# Altium footprint library Molex FFC - FPC Connectors (Through-Hole).PcbLib: 219 footprints (part 6 of 14)
Each footprint in its own frame and in the unit in brackets; x right, y up, seen from the top. Pads: shape width x height; smd on the part's side, far side on the other; paste and mask are expansions set on the pad; w line width, h text height; cw(c..) or ccw(c..) is an arc to the next point about the centre after c.
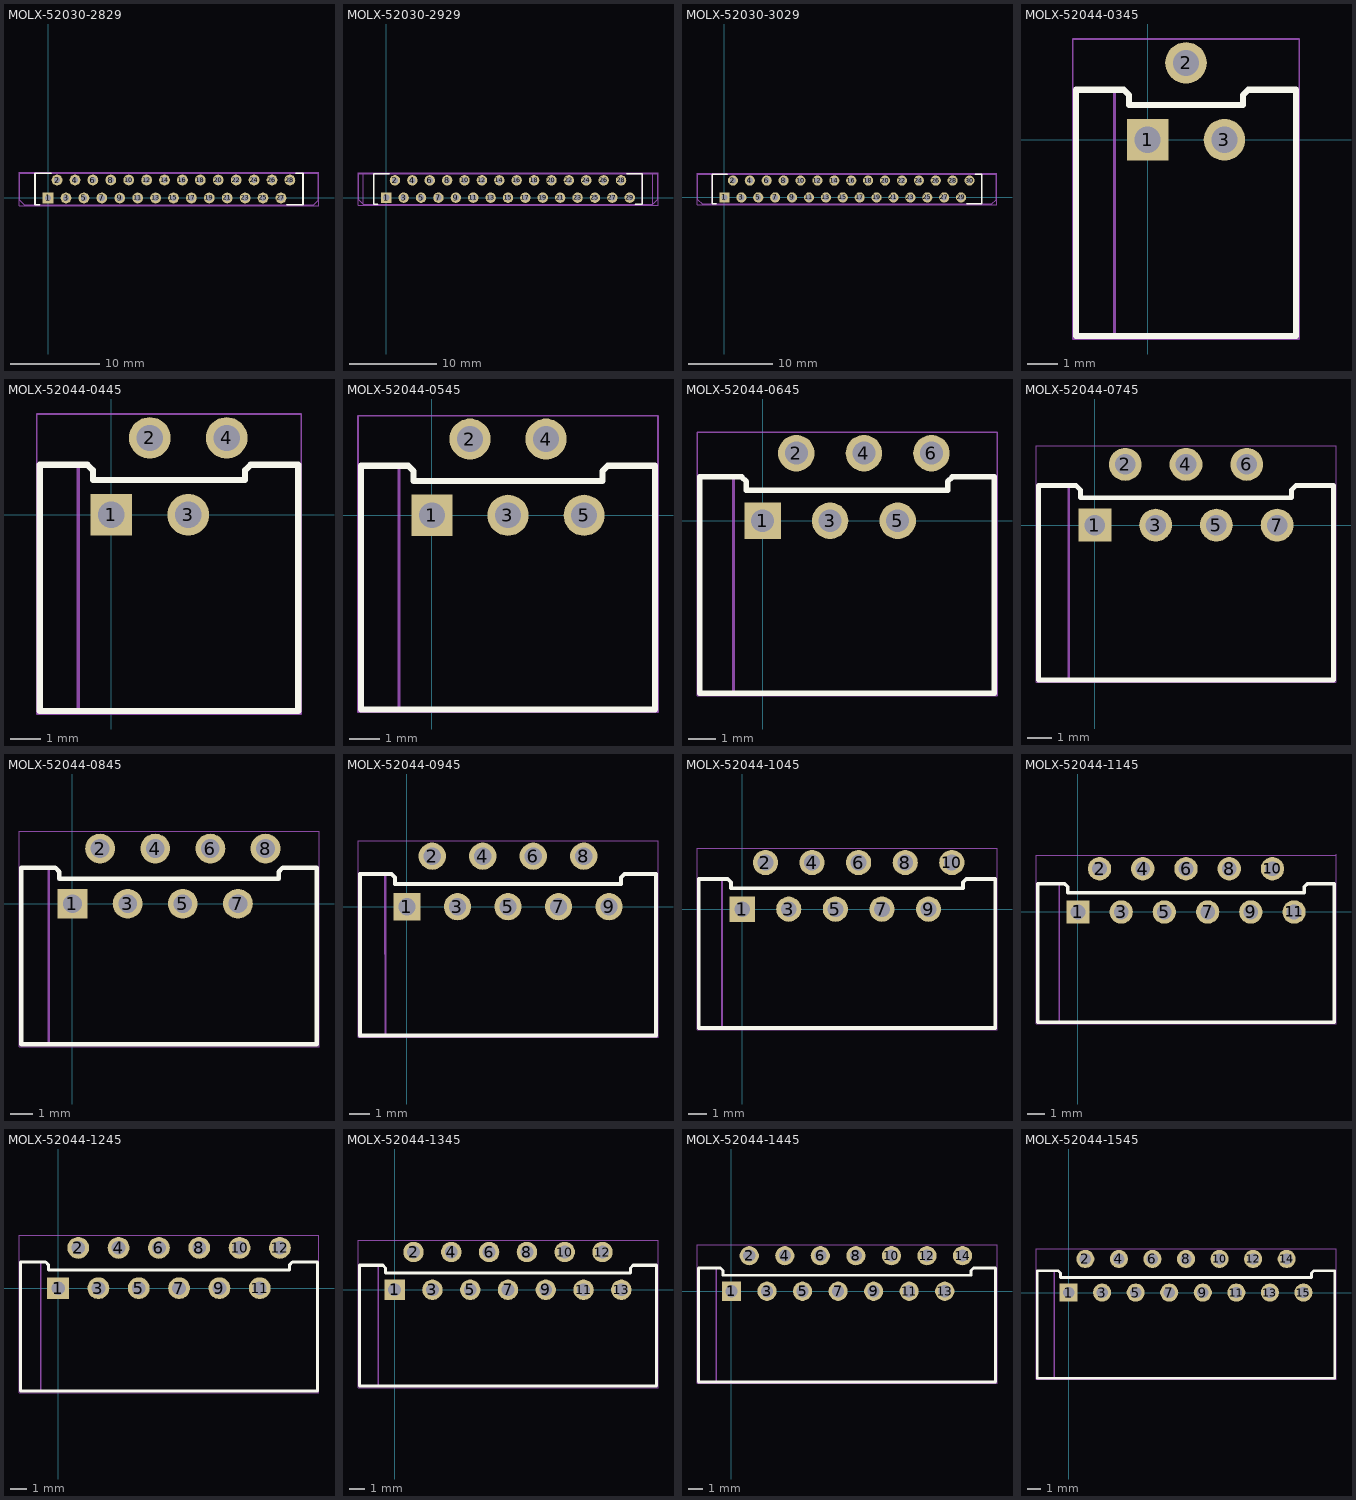
[diagram p5: the footprints below, top view; thin cyan lines are the x and y axes]

## MOLX-52030-2829 [mm] "FPC Connector, 28-Leads, Vertical, Pitch 1.0 mm, Mated Height 5.2 mm, Through Hole"
height 6.712
pads (28):
  rect 1.2x1.2 hole 0.7: 1(0,0)
  round 1.2 hole 0.7: 2(1,2) 3(2,0) 4(3,2) 5(4,0) 6(5,2) 7(6,0) 8(7,2) 9(8,0) 10(9,2) 11(10,0) 12(11,2) 13(12,0) 14(13,2) 15(14,0) 16(15,2) 17(16,0) 18(17,2) 19(18,0) 20(19,2) 21(20,0) 22(21,2) 23(22,0) 24(23,2) 25(24,0) 26(25,2) 27(26,0) 28(27,2)
Top Overlay:
  lines w0.2: -0.971,-0.75 -1.45,-0.75 -1.45,2.75 0.339,2.75 ; 26.661,-0.75 28.45,-0.75 28.45,2.75 27.662,2.75
Mechanical 13:
  lines w0.1: -3.15,2.75 30.15,2.75 30.15,-0.25 29.65,-0.749 ; -3.15,2.75 -3.15,-0.25 -2.65,-0.75 29.65,-0.75 ; -1.45,-0.75 -1.45,2.75 ; 28.45,-0.75 28.45,2.75
Mechanical 15:
  lines w0.05: -3.25,-0.85 -3.25,2.85 30.25,2.85 30.25,-0.85 -3.25,-0.85
3D body "520302829.stp": height 6.71, standoff -3.19, extent -3.15,-0.75 30.15,2.75

## MOLX-52030-2929 [mm] "FPC Connector, 29-Leads, Vertical, Pitch 1.0 mm, Mated Height 5.2 mm, Through Hole"
height 6.712
pads (29):
  rect 1.2x1.2 hole 0.7: 1(0,0)
  round 1.2 hole 0.7: 2(1,2) 3(2,0) 4(3,2) 5(4,0) 6(5,2) 7(6,0) 8(7,2) 9(8,0) 10(9,2) 11(10,0) 12(11,2) 13(12,0) 14(13,2) 15(14,0) 16(15,2) 17(16,0) 18(17,2) 19(18,0) 20(19,2) 21(20,0) 22(21,2) 23(22,0) 24(23,2) 25(24,0) 26(25,2) 27(26,0) 28(27,2) 29(28,0)
Top Overlay:
  lines w0.2: -0.971,-0.75 -1.45,-0.75 -1.45,2.75 0.339,2.75 ; 27.661,2.75 29.45,2.75 29.45,-0.75 28.662,-0.75
Mechanical 13:
  lines w0.1: -2.65,-0.75 -1.45,-0.75 ; -2.65,-0.75 -2.65,2.75 ; -2.65,-0.75 -3.15,-0.25 -3.15,2.75 -2.65,2.75 ; -2.65,2.75 -1.45,2.75 ; -1.45,-0.75 29.45,-0.75 ; -1.45,-0.75 -1.45,2.75 ; -1.45,2.75 29.45,2.75 ; 29.45,-0.75 29.45,2.75 ; 29.45,-0.75 30.65,-0.75 ; 29.45,2.75 30.65,2.75 ; 30.65,-0.75 30.65,2.75 ; 30.65,-0.75 31.15,-0.25 31.15,2.75 30.65,2.75
Mechanical 15:
  lines w0.05: -3.25,-0.85 -3.25,2.85 31.25,2.85 31.25,-0.85 -3.25,-0.85
3D body "520302929.stp": height 6.71, standoff -3.19, extent -3.15,-0.75 31.15,2.75

## MOLX-52030-3029 [mm] "FPC Connector, 30-Leads, Vertical, Pitch 1.0 mm, Mated Height 5.2 mm, Through Hole"
height 6.712
pads (30):
  rect 1.2x1.2 hole 0.7: 1(0,0)
  round 1.2 hole 0.7: 2(1,2) 3(2,0) 4(3,2) 5(4,0) 6(5,2) 7(6,0) 8(7,2) 9(8,0) 10(9,2) 11(10,0) 12(11,2) 13(12,0) 14(13,2) 15(14,0) 16(15,2) 17(16,0) 18(17,2) 19(18,0) 20(19,2) 21(20,0) 22(21,2) 23(22,0) 24(23,2) 25(24,0) 26(25,2) 27(26,0) 28(27,2) 29(28,0) 30(29,2)
Top Overlay:
  lines w0.2: -0.971,-0.75 -1.45,-0.75 -1.45,2.75 0.339,2.75 ; 28.661,-0.75 30.45,-0.75 30.45,2.75 29.661,2.75
Mechanical 13:
  lines w0.1: -1.45,-0.75 -1.45,2.75 ; 30.45,-0.75 30.45,2.75 ; -3.15,-0.25 -3.15,2.75 32.15,2.75 32.15,-0.25 31.65,-0.75 -2.65,-0.75 -3.15,-0.25
Mechanical 15:
  lines w0.05: -3.25,-0.85 -3.25,2.85 32.25,2.85 32.25,-0.85 -3.25,-0.85
3D body "520303029.stp": height 6.71, standoff -3.19, extent -3.15,-0.75 32.15,2.75

## MOLX-52044-0345 [mm] "FFC Connector, 3-Leads, Right Angle, Pitch 1.25 mm, Mated Height 5.1 mm, Through Hole"
height 5.012
pads (3):
  rect 1.35x1.35 hole 0.85: 1(0,0)
  round 1.35 hole 0.85: 2(1.25,2.5) 3(2.5,0)
Top Overlay:
  lines w0.2: -0.775,1.625 -0.6,1.45 -0.6,1.125 3.1,1.125 3.1,1.45 3.275,1.625 ; -0.775,1.625 -0.775,1.625 ; -0.775,1.625 -2.325,1.625 -2.325,-6.375 4.825,-6.375 4.825,1.625 3.275,1.625 ; 3.275,1.625 3.275,1.625
Mechanical 13:
  lines w0.1: -1.075,-6.375 -1.075,1.625 ; -2.325,-6.375 -2.325,1.625 -0.775,1.625 -0.6,1.45 -0.6,1.125 3.1,1.125 3.1,1.45 3.275,1.625 4.825,1.625 4.825,-6.375 -2.325,-6.375
Mechanical 15:
  lines w0.05: -2.425,-6.475 4.925,-6.475 4.925,3.275 -2.425,3.275 -2.425,-6.475
3D body "520440345.stp": height 5.01, standoff -3.49, extent -2.325,-6.375 4.825,2.625

## MOLX-52044-0445 [mm] "FFC Connector, 4-Leads, Right Angle, Pitch 1.25 mm, Mated Height 5.1 mm, Through Hole"
height 5.012
pads (4):
  rect 1.35x1.35 hole 0.85: 1(0,0)
  round 1.35 hole 0.85: 2(1.25,2.5) 3(2.5,0) 4(3.75,2.5)
Top Overlay:
  lines w0.2: -2.325,-6.375 -2.325,1.625 -0.775,1.625 ; -2.325,-6.375 6.075,-6.375 ; 6.075,-6.375 6.075,1.625 4.525,1.625 ; -0.775,1.625 -0.775,1.625 ; -0.775,1.625 -0.6,1.45 -0.6,1.125 4.35,1.125 4.35,1.45 4.525,1.625 ; 4.525,1.625 4.525,1.625
Mechanical 13:
  lines w0.1: -1.075,-6.375 -1.075,1.625 ; 6.075,1.625 6.075,-6.375 -2.325,-6.375 -2.325,-6.375 ; 6.075,1.625 4.525,1.625 4.35,1.45 4.35,1.125 -0.6,1.125 -0.6,1.45 -0.775,1.625 -2.325,1.625 -2.325,-6.375 ; -2.325,-6.375 -2.325,-6.375
Mechanical 15:
  lines w0.05: -2.425,-6.475 -2.425,3.275 6.175,3.275 6.175,-6.475 -2.425,-6.475
3D body "520440445.stp": height 5.01, standoff -3.49, extent -2.325,-6.375 6.075,2.625

## MOLX-52044-0545 [mm] "FFC Connector, 5-Leads, Right Angle, Pitch 1.25 mm, Mated Height 5.1 mm, Through Hole"
height 5.012
pads (5):
  rect 1.35x1.35 hole 0.85: 1(0,0)
  round 1.35 hole 0.85: 2(1.25,2.5) 3(2.5,0) 4(3.75,2.5) 5(5,0)
Top Overlay:
  lines w0.2: 5.6,1.125 5.6,1.45 5.775,1.625 ; 5.6,1.125 -0.6,1.125 -0.6,1.45 -0.775,1.625 ; -0.775,1.625 -0.775,1.625 ; -0.775,1.625 -2.325,1.625 -2.325,-6.375 7.325,-6.375 7.325,1.625 5.775,1.625 ; 5.775,1.625 5.775,1.625
Mechanical 13:
  lines w0.1: -1.075,-6.375 -1.075,1.625 ; -2.325,-6.375 -2.325,1.625 -0.775,1.625 -0.6,1.45 -0.6,1.125 5.6,1.125 5.6,1.45 5.775,1.625 7.325,1.625 7.325,-6.375 -2.325,-6.375
Mechanical 15:
  lines w0.05: -2.425,-6.475 7.425,-6.475 7.425,3.275 -2.425,3.275 -2.425,-6.475
3D body "520440545.stp": height 5.01, standoff -3.49, extent -2.325,-6.375 7.325,2.625

## MOLX-52044-0645 [mm] "FFC Connector, 6-Leads, Right Angle, Pitch 1.25 mm, Mated Height 5.1 mm, Through Hole"
height 5.012
pads (6):
  rect 1.35x1.35 hole 0.85: 1(0,0)
  round 1.35 hole 0.85: 2(1.25,2.5) 3(2.5,0) 4(3.75,2.5) 5(5,0) 6(6.25,2.5)
Top Overlay:
  lines w0.2: -2.325,1.625 -2.325,-6.375 8.575,-6.375 8.575,1.625 ; -2.325,1.625 -0.775,1.625 ; 8.575,1.625 7.025,1.625 7.025,1.625 6.85,1.45 6.85,1.125 -0.6,1.125 -0.6,1.45 -0.775,1.625 ; -0.775,1.625 -0.775,1.625
Mechanical 13:
  lines w0.1: -1.075,-6.375 -1.075,1.625 ; 8.575,1.625 8.575,-6.375 -2.325,-6.375 -2.325,1.625 -0.775,1.625 -0.6,1.45 -0.6,1.125 6.85,1.125 6.85,1.45 7.025,1.625 8.575,1.625
Mechanical 15:
  lines w0.05: -2.425,-6.475 -2.425,3.275 8.675,3.275 8.675,-6.475 -2.425,-6.475
3D body "520440645.stp": height 5.01, standoff -3.49, extent -2.325,-6.375 8.575,2.625

## MOLX-52044-0745 [mm] "FFC Connector, 7-Leads, Right Angle, Pitch 1.25 mm, Mated Height 5.1 mm, Through Hole"
height 5.012
pads (7):
  rect 1.35x1.35 hole 0.85: 1(0,0)
  round 1.35 hole 0.85: 2(1.25,2.5) 3(2.5,0) 4(3.75,2.5) 5(5,0) 6(6.25,2.5) 7(7.5,0)
Top Overlay:
  lines w0.2: -2.325,-6.375 9.825,-6.375 9.825,1.625 8.275,1.625 8.1,1.45 8.1,1.125 -0.6,1.125 -0.6,1.45 -0.775,1.625 -2.325,1.625 -2.325,-6.375
Mechanical 13:
  lines w0.1: -1.075,-6.375 -1.075,1.625 ; -1.075,1.625 -0.775,1.625 -0.6,1.45 -0.6,1.125 8.1,1.125 8.1,1.45 8.275,1.625 9.825,1.625 9.825,-6.375 -2.325,-6.375 -2.325,1.625 -1.075,1.625
Mechanical 15:
  lines w0.05: -2.425,-6.475 -2.425,3.275 9.925,3.275 9.925,-6.475 -2.425,-6.475
3D body "520440745.stp": height 5.01, standoff -3.49, extent -2.325,-6.375 9.825,2.625

## MOLX-52044-0845 [mm] "FFC Connector, 8-Leads, Right Angle, Pitch 1.25 mm, Mated Height 5.1 mm, Through Hole"
height 5.012
pads (8):
  rect 1.35x1.35 hole 0.85: 1(0,0)
  round 1.35 hole 0.85: 2(1.25,2.5) 3(2.5,0) 4(3.75,2.5) 5(5,0) 6(6.25,2.5) 7(7.5,0) 8(8.75,2.5)
Top Overlay:
  lines w0.2: -0.775,1.625 -0.6,1.45 -0.6,1.125 9.35,1.125 9.35,1.45 9.525,1.625 ; -0.775,1.625 -0.775,1.625 ; -0.775,1.625 -2.325,1.625 -2.325,-6.375 11.075,-6.375 11.075,1.625 9.525,1.625 ; 9.525,1.625 9.525,1.625
Mechanical 13:
  lines w0.1: -1.075,-6.375 -1.075,1.625 ; -0.6,1.125 -0.6,1.45 -0.775,1.625 -2.325,1.625 -2.325,-6.375 11.075,-6.375 11.075,1.625 ; -0.6,1.125 9.35,1.125 9.35,1.45 9.525,1.625 11.075,1.625
Mechanical 15:
  lines w0.05: -2.425,-6.475 11.175,-6.475 11.175,3.275 -2.425,3.275 -2.425,-6.475
3D body "520440845.stp": height 5.01, standoff -3.49, extent -2.325,-6.375 11.075,2.625

## MOLX-52044-0945 [mm] "FFC Connector, 9-Leads, Right Angle, Pitch 1.25 mm, Mated Height 5.1 mm, Through Hole"
height 5.012
pads (9):
  rect 1.35x1.35 hole 0.85: 1(0,0)
  round 1.35 hole 0.85: 2(1.25,2.5) 3(2.5,0) 4(3.75,2.5) 5(5,0) 6(6.25,2.5) 7(7.5,0) 8(8.75,2.5) 9(10,0)
Top Overlay:
  lines w0.2: -0.775,1.625 -2.325,1.625 -2.325,-6.375 12.325,-6.375 12.325,1.625 10.775,1.625 ; -0.775,1.625 -0.775,1.625 ; -0.775,1.625 -0.6,1.45 -0.6,1.125 10.6,1.125 10.6,1.45 10.775,1.625 ; 10.775,1.625 10.775,1.625
Mechanical 13:
  lines w0.1: -1.076,1.611 -1.075,-6.375 ; 10.6,1.125 -0.6,1.125 -0.6,1.45 -0.775,1.625 -2.325,1.625 -2.325,-6.375 12.325,-6.375 12.325,1.625 10.775,1.625 10.6,1.45 10.6,1.125
Mechanical 15:
  lines w0.05: -2.425,-6.475 12.425,-6.475 12.425,3.275 -2.425,3.275 -2.425,-6.475
3D body "520440945.stp": height 5.01, standoff -3.49, extent -2.325,-6.375 12.325,2.625

## MOLX-52044-1045 [mm] "FFC Connector, 10-Leads, Right Angle, Pitch 1.25 mm, Mated Height 5.1 mm, Through Hole"
height 5.012
pads (10):
  rect 1.35x1.35 hole 0.85: 1(0,0)
  round 1.35 hole 0.85: 2(1.25,2.5) 3(2.5,0) 4(3.75,2.5) 5(5,0) 6(6.25,2.5) 7(7.5,0) 8(8.75,2.5) 9(10,0) 10(11.25,2.5)
Top Overlay:
  lines w0.2: 12.025,1.625 13.575,1.625 13.575,-6.375 -2.325,-6.375 -2.325,1.625 -0.775,1.625 -0.6,1.45 -0.6,1.125 11.85,1.125 11.85,1.45 12.025,1.625 ; 12.025,1.625 12.025,1.625
Mechanical 13:
  lines w0.1: -1.075,-6.375 -1.075,1.625 ; -1.075,1.625 -2.325,1.625 -2.325,-6.375 13.575,-6.375 13.575,1.625 12.025,1.625 11.85,1.45 11.85,1.125 -0.6,1.125 -0.6,1.45 -0.775,1.625 -1.075,1.625
Mechanical 15:
  lines w0.05: -2.425,-6.475 13.675,-6.475 13.675,3.275 -2.425,3.275 -2.425,-6.475
3D body "520441045.stp": height 5.01, standoff -3.49, extent -2.325,-6.375 13.575,2.625

## MOLX-52044-1145 [mm] "FFC Connector, 11-Leads, Right Angle, Pitch 1.25 mm, Mated Height 5.1 mm, Through Hole"
height 5.012
pads (11):
  rect 1.35x1.35 hole 0.85: 1(0,0)
  round 1.35 hole 0.85: 2(1.25,2.5) 3(2.5,0) 4(3.75,2.5) 5(5,0) 6(6.25,2.5) 7(7.5,0) 8(8.75,2.5) 9(10,0) 10(11.25,2.5) 11(12.5,0)
Top Overlay:
  lines w0.2: -2.325,-6.375 -2.325,1.625 -0.775,1.625 -0.6,1.45 -0.6,1.125 13.1,1.125 13.1,1.45 13.275,1.625 14.825,1.625 14.825,-6.375 -2.325,-6.375
Mechanical 13:
  lines w0.1: -1.075,-6.375 -1.075,1.625 ; -2.325,-6.375 -2.325,1.625 -0.775,1.625 -0.6,1.45 -0.6,1.125 13.1,1.125 13.1,1.45 13.275,1.625 14.825,1.625 14.825,-6.375 -2.325,-6.375
Mechanical 15:
  lines w0.05: 14.925,3.275 -2.425,3.275 -2.425,-6.475 14.925,-6.475 14.925,3.35
3D body "520441145.stp": height 5.01, standoff -3.49, extent -2.325,-6.375 14.825,2.625

## MOLX-52044-1245 [mm] "FFC Connector, 12-Leads, Right Angle, Pitch 1.25 mm, Mated Height 5.1 mm, Through Hole"
height 5.012
pads (12):
  rect 1.35x1.35 hole 0.85: 1(0,0)
  round 1.35 hole 0.85: 2(1.25,2.5) 3(2.5,0) 4(3.75,2.5) 5(5,0) 6(6.25,2.5) 7(7.5,0) 8(8.75,2.5) 9(10,0) 10(11.25,2.5) 11(12.5,0) 12(13.75,2.5)
Top Overlay:
  lines w0.2: 16.075,-6.375 16.075,1.625 14.525,1.625 14.35,1.45 14.35,1.125 -0.6,1.125 -0.6,1.45 -0.775,1.625 -2.325,1.625 -2.325,-6.375 16.075,-6.375
Mechanical 13:
  lines w0.1: -1.075,-6.375 -1.075,1.625 ; 14.525,1.625 16.075,1.625 16.075,-6.375 -2.325,-6.375 -2.325,1.625 -0.775,1.625 -0.6,1.45 -0.6,1.125 14.35,1.125 14.35,1.45 14.525,1.625 ; 14.525,1.625 14.525,1.625
Mechanical 15:
  lines w0.05: -2.425,-6.475 -2.425,3.275 16.175,3.275 16.175,-6.475 -2.425,-6.475
3D body "520441245.stp": height 5.01, standoff -3.49, extent -2.325,-6.375 16.075,2.625

## MOLX-52044-1345 [mm] "FFC Connector, 13-Leads, Right Angle, Pitch 1.25 mm, Mated Height 5.1 mm, Through Hole"
height 5.012
pads (13):
  rect 1.35x1.35 hole 0.85: 1(0,0)
  round 1.35 hole 0.85: 2(1.25,2.5) 3(2.5,0) 4(3.75,2.5) 5(5,0) 6(6.25,2.5) 7(7.5,0) 8(8.75,2.5) 9(10,0) 10(11.25,2.5) 11(12.5,0) 12(13.75,2.5) 13(15,0)
Top Overlay:
  lines w0.2: -0.775,1.625 -0.6,1.45 -0.6,1.125 15.6,1.125 15.6,1.45 15.775,1.625 17.325,1.625 17.325,-6.375 -2.325,-6.375 -2.325,1.625 -0.775,1.625 ; -0.775,1.625 -0.775,1.625
Mechanical 13:
  lines w0.1: -1.075,-6.375 -1.075,1.625 ; -1.075,1.625 -2.325,1.625 -2.325,-6.375 17.325,-6.375 17.325,1.625 15.775,1.625 15.6,1.45 15.6,1.125 -0.6,1.125 -0.6,1.45 -0.775,1.625 -1.075,1.625
Mechanical 15:
  lines w0.05: -2.425,-6.475 17.425,-6.475 17.425,3.275 -2.425,3.275 -2.425,-6.475
3D body "520441345.stp": height 5.01, standoff -3.49, extent -2.325,-6.375 17.325,2.625

## MOLX-52044-1445 [mm] "FFC Connector, 14-Leads, Right Angle, Pitch 1.25 mm, Mated Height 5.1 mm, Through Hole"
height 5.012
pads (14):
  rect 1.35x1.35 hole 0.85: 1(0,0)
  round 1.35 hole 0.85: 2(1.25,2.5) 3(2.5,0) 4(3.75,2.5) 5(5,0) 6(6.25,2.5) 7(7.5,0) 8(8.75,2.5) 9(10,0) 10(11.25,2.5) 11(12.5,0) 12(13.75,2.5) 13(15,0) 14(16.25,2.5)
Top Overlay:
  lines w0.2: -2.325,-6.375 -2.325,1.625 -0.775,1.625 -0.6,1.45 -0.6,1.125 16.85,1.125 16.85,1.45 17.025,1.625 18.575,1.625 18.575,-6.375 -2.325,-6.375
Mechanical 13:
  lines w0.1: -1.075,-6.375 -1.075,1.625 ; -1.075,1.625 -2.325,1.625 -2.325,-6.375 18.575,-6.375 18.575,1.625 17.025,1.625 16.85,1.45 16.85,1.125 -0.6,1.125 -0.6,1.45 -0.775,1.625 -1.075,1.625
Mechanical 15:
  lines w0.05: -2.425,-6.475 18.675,-6.475 18.675,3.275 -2.425,3.275 -2.425,-6.475
3D body "520441445.stp": height 5.01, standoff -3.49, extent -2.325,-6.375 18.575,2.625

## MOLX-52044-1545 [mm] "FFC Connector, 15-Leads, Right Angle, Pitch 1.25 mm, Mated Height 5.1 mm, Through Hole"
height 5.012
pads (15):
  rect 1.35x1.35 hole 0.85: 1(0,0)
  round 1.35 hole 0.85: 2(1.25,2.5) 3(2.5,0) 4(3.75,2.5) 5(5,0) 6(6.25,2.5) 7(7.5,0) 8(8.75,2.5) 9(10,0) 10(11.25,2.5) 11(12.5,0) 12(13.75,2.5) 13(15,0) 14(16.25,2.5) 15(17.5,0)
Top Overlay:
  lines w0.2: -2.325,-6.375 19.825,-6.375 19.825,1.625 18.275,1.625 18.1,1.45 18.1,1.125 -0.6,1.125 -0.6,1.45 -0.775,1.625 -2.325,1.625 -2.325,-6.375
Mechanical 13:
  lines w0.1: -1.075,-6.375 -1.075,1.625 ; -2.325,-6.375 -2.325,1.625 -0.775,1.625 -0.6,1.45 -0.6,1.125 18.1,1.125 18.1,1.45 18.275,1.625 19.825,1.625 19.825,-6.375 19.825,-6.375 -2.325,-6.375
Mechanical 15:
  lines w0.05: -2.425,-6.475 19.925,-6.475 19.925,3.275 -2.425,3.275 -2.425,-6.475
3D body "520441545.stp": height 5.01, standoff -3.49, extent -2.325,-6.375 19.825,2.625